# Altium footprint library BBC_Footprints.PcbLib: 172 footprints (part 10 of 11)
Each footprint in its own frame and in the unit in brackets; x right, y up, seen from the top. Pads: shape width x height; smd on the part's side, far side on the other; paste and mask are expansions set on the pad; w line width, h text height; cw(c..) or ccw(c..) is an arc to the next point about the centre after c.
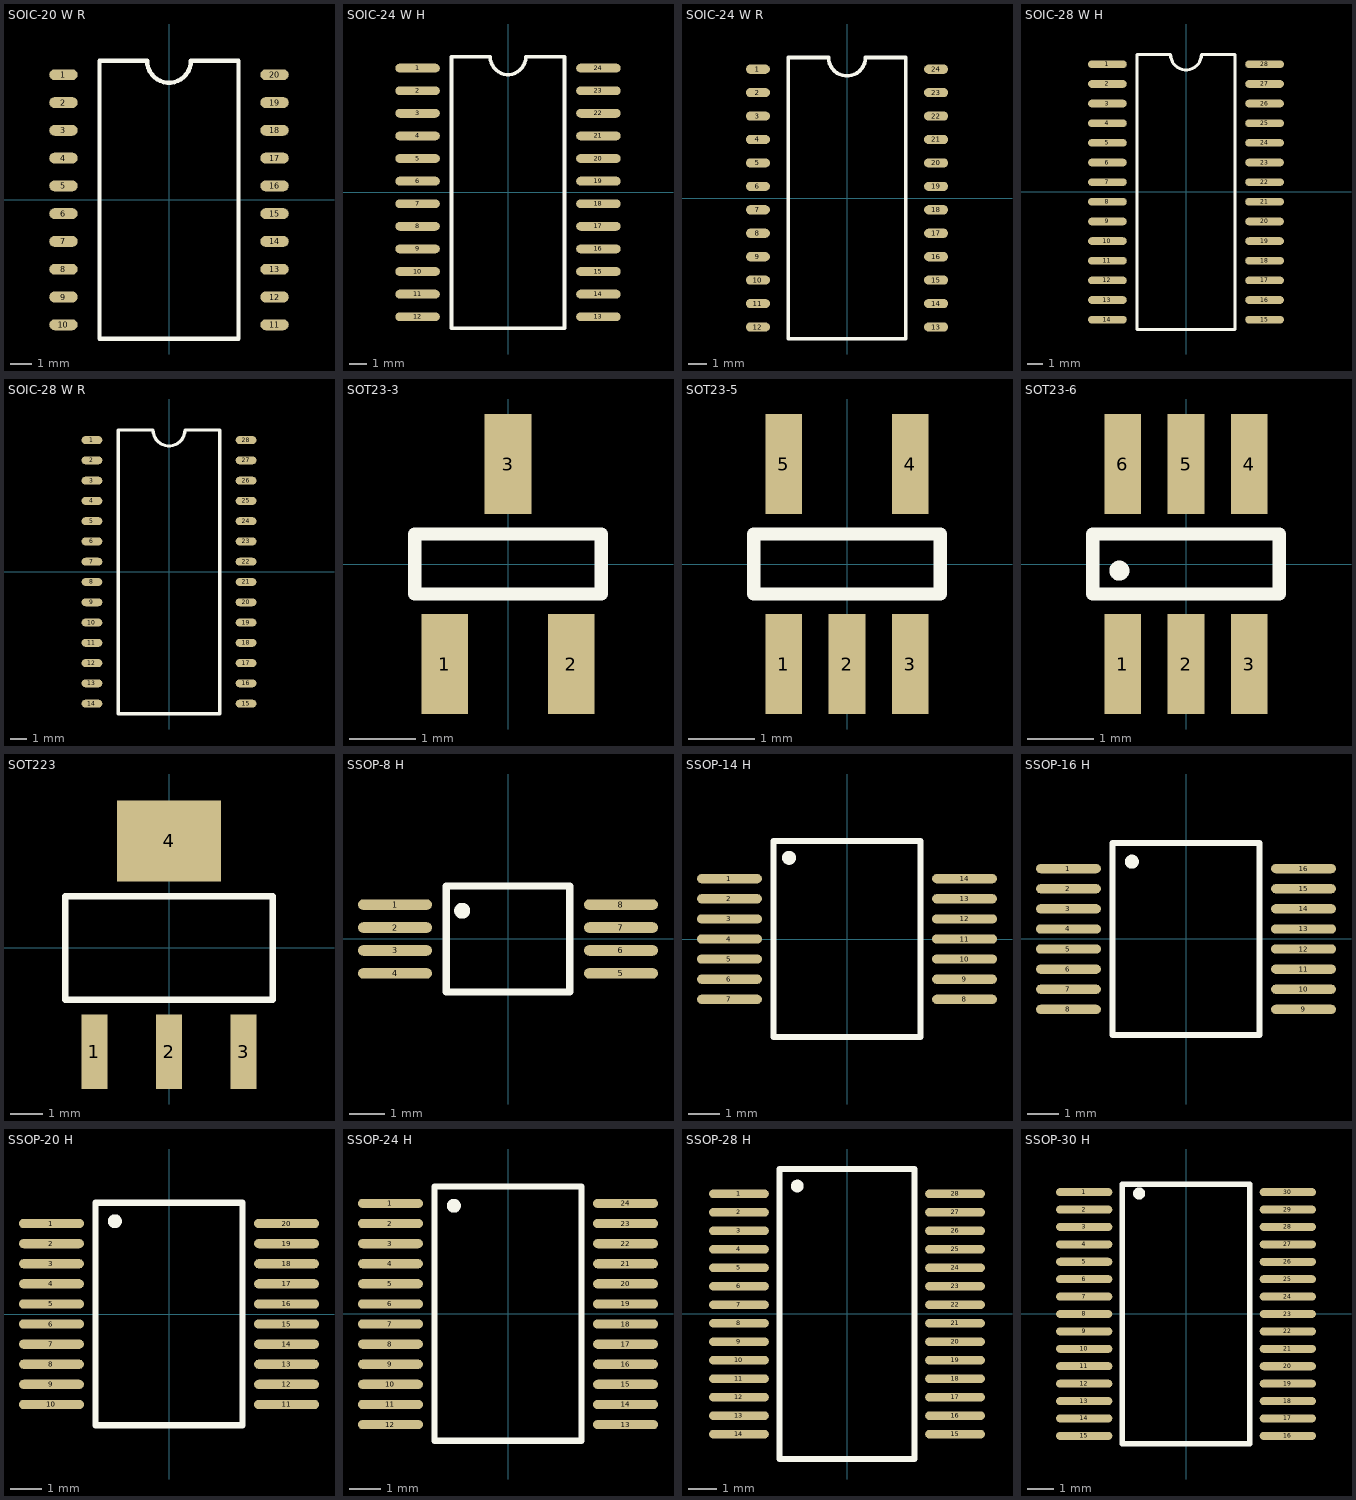
[diagram p9: the footprints below, top view; thin cyan lines are the x and y axes]

## SOIC-20 W R [mm] "Wide (300mil) SOIC with 20 pins for reflow soldering"
height 3
pads (20):
  oval 1.3x0.5 smd: 1(-4.826,5.715) 2(-4.826,4.445) 3(-4.826,3.175) 4(-4.826,1.905) 5(-4.826,0.635) 6(-4.826,-0.635) 7(-4.826,-1.905) 8(-4.826,-3.175) 9(-4.826,-4.445) 10(-4.826,-5.715) 11(4.826,-5.715) 12(4.826,-4.445) 13(4.826,-3.175) 14(4.826,-1.905) 15(4.826,-0.635) 16(4.826,0.635) 17(4.826,1.905) 18(4.826,3.175) 19(4.826,4.445) 20(4.826,5.715)
Top Overlay:
  lines w0.2: -3.175,-6.35 -3.175,6.35 -1,6.35 ccw(c0,6.35) 1,6.35 3.175,6.35 3.175,-6.35 -3.175,-6.35
3D body "SOIC-20 W.step": height 2.65, standoff 0, extent -5.242,-6.425 5.243,6.425

## SOIC-24 W H [mm] "Wide (300mil) SOIC with 24 pins for hand soldering"
height 3
pads (24):
  oval 2.5x0.5 smd: 1(-5.08,6.985) 2(-5.08,5.715) 3(-5.08,4.445) 4(-5.08,3.175) 5(-5.08,1.905) 6(-5.08,0.635) 7(-5.08,-0.635) 8(-5.08,-1.905) 9(-5.08,-3.175) 10(-5.08,-4.445) 11(-5.08,-5.715) 12(-5.08,-6.985) 13(5.08,-6.985) 14(5.08,-5.715) 15(5.08,-4.445) 16(5.08,-3.175) 17(5.08,-1.905) 18(5.08,-0.635) 19(5.08,0.635) 20(5.08,1.905) 21(5.08,3.175) 22(5.08,4.445) 23(5.08,5.715) 24(5.08,6.985)
Top Overlay:
  lines w0.2: -3.175,-7.62 3.175,-7.62 3.175,7.62 1,7.62 cw(c0,7.62) -1,7.62 -3.175,7.62 -3.175,-7.62
3D body "SOIC-24 W.step": height 2.65, standoff 0, extent -5.242,-7.725 5.243,7.725

## SOIC-24 W R [mm] "Wide (300mil) SOIC with 24 pins for reflow soldering"
height 3
pads (24):
  oval 1.3x0.5 smd: 1(-4.826,6.985) 2(-4.826,5.715) 3(-4.826,4.445) 4(-4.826,3.175) 5(-4.826,1.905) 6(-4.826,0.635) 7(-4.826,-0.635) 8(-4.826,-1.905) 9(-4.826,-3.175) 10(-4.826,-4.445) 11(-4.826,-5.715) 12(-4.826,-6.985) 13(4.826,-6.985) 14(4.826,-5.715) 15(4.826,-4.445) 16(4.826,-3.175) 17(4.826,-1.905) 18(4.826,-0.635) 19(4.826,0.635) 20(4.826,1.905) 21(4.826,3.175) 22(4.826,4.445) 23(4.826,5.715) 24(4.826,6.985)
Top Overlay:
  lines w0.2: -3.175,-7.62 3.175,-7.62 3.175,7.62 1,7.62 cw(c0,7.62) -1,7.62 -3.175,7.62 -3.175,-7.62
3D body "SOIC-24 W.step": height 2.65, standoff 0, extent -5.242,-7.725 5.243,7.725

## SOIC-28 W H [mm] "Wide (300mil) SOIC with 28 pins for hand soldering"
height 3
pads (28):
  oval 2.5x0.5 smd: 1(-5.08,8.255) 2(-5.08,6.985) 3(-5.08,5.715) 4(-5.08,4.445) 5(-5.08,3.175) 6(-5.08,1.905) 7(-5.08,0.635) 8(-5.08,-0.635) 9(-5.08,-1.905) 10(-5.08,-3.175) 11(-5.08,-4.445) 12(-5.08,-5.715) 13(-5.08,-6.985) 14(-5.08,-8.255) 15(5.08,-8.255) 16(5.08,-6.985) 17(5.08,-5.715) 18(5.08,-4.445) 19(5.08,-3.175) 20(5.08,-1.905) 21(5.08,-0.635) 22(5.08,0.635) 23(5.08,1.905) 24(5.08,3.175) 25(5.08,4.445) 26(5.08,5.715) 27(5.08,6.985) 28(5.08,8.255)
Top Overlay:
  lines w0.2: -3.175,-8.89 3.175,-8.89 3.175,8.89 1,8.89 cw(c0,8.89) -1,8.89 -3.175,8.89 -3.175,-8.89
3D body "SOIC-28 1.step": height 2.65, standoff 0, extent -5.242,-8.975 5.243,8.975

## SOIC-28 W R [mm] "Wide (300mil) SOIC with 28 pins for reflow soldering"
height 3
pads (28):
  oval 1.3x0.5 smd: 1(-4.826,8.255) 2(-4.826,6.985) 3(-4.826,5.715) 4(-4.826,4.445) 5(-4.826,3.175) 6(-4.826,1.905) 7(-4.826,0.635) 8(-4.826,-0.635) 9(-4.826,-1.905) 10(-4.826,-3.175) 11(-4.826,-4.445) 12(-4.826,-5.715) 13(-4.826,-6.985) 14(-4.826,-8.255) 15(4.826,-8.255) 16(4.826,-6.985) 17(4.826,-5.715) 18(4.826,-4.445) 19(4.826,-3.175) 20(4.826,-1.905) 21(4.826,-0.635) 22(4.826,0.635) 23(4.826,1.905) 24(4.826,3.175) 25(4.826,4.445) 26(4.826,5.715) 27(4.826,6.985) 28(4.826,8.255)
Top Overlay:
  lines w0.2: -3.175,-8.89 3.175,-8.89 3.175,8.89 1,8.89 cw(c0,8.89) -1,8.89 -3.175,8.89 -3.175,-8.89
3D body "SOIC-28 1.step": height 2.65, standoff 0, extent -5.242,-8.975 5.243,8.975

## SOT23-3 [mm] "SOT23-3"
height 1.45
pads (3):
  rect 0.7x1.5 smd: 1(-0.95,-1.5) 2(0.95,-1.5) 3(0,1.5)
Top Overlay:
  lines w0.2: -1.4,-0.45 1.4,-0.45 1.4,0.45 -1.4,0.45 -1.4,-0.45
3D body "User Library-SOT23-3.STEP": height 1.3, standoff 0, extent -1.45,-1.4 1.45,1.4

## SOT23-5 [mm] "SOT23-5"
height 1.45
pads (5):
  rect 0.55x1.5 smd: 1(-0.95,-1.5) 2(0,-1.5) 3(0.95,-1.5) 4(0.95,1.5) 5(-0.95,1.5)
Top Overlay:
  lines w0.2: -1.4,-0.45 1.4,-0.45 1.4,0.45 -1.4,0.45 -1.4,-0.45
3D body "User Library-SOT23-5.STEP": height 1.24, standoff 0.14, extent -1.452,-1.4 1.448,1.4

## SOT23-6 [mm] "SOT23-6"
height 1.45
pads (6):
  rect 0.55x1.5 smd: 1(-0.95,-1.5) 2(0,-1.5) 3(0.95,-1.5) 4(0.95,1.5) 5(0,1.5) 6(-0.95,1.5)
Top Overlay:
  circle w0.2: c-1,-0.1 r0.05
  lines w0.2: -1.4,-0.45 -1.4,0.45 1.4,0.45 1.4,-0.45 -1.4,-0.45
3D body "DBV-6 Package.stp": height 1.1, standoff -0.01, extent -1.46,-1.422 1.461,1.422

## SOT223 [mm] "SOT223"
height 1.45
pads (4):
  rect 0.8x2.3 smd: 1(-2.3,-3.2) 2(0,-3.2) 3(2.3,-3.2)
  rect 3.2x2.5 smd: 4(0,3.3)
Top Overlay:
  lines w0.2: -3.2,-1.6 3.2,-1.6 3.2,1.6 -3.2,1.6 -3.2,-1.6
3D body "SOT-223.step": height 1.7, standoff 0.02, extent -3.25,-3.48 3.25,3.48

## SSOP-8 H [mm] "SSOP-8 for hand soldering"
height 3
pads (8):
  oval 2.1x0.3 smd: 1(-3.2,0.975) 2(-3.2,0.325) 3(-3.2,-0.325) 4(-3.2,-0.975) 5(3.2,-0.975) 6(3.2,-0.325) 7(3.2,0.325) 8(3.2,0.975)
Top Overlay:
  circle w0.25: c-1.3,0.8 r0.1
  lines w0.2: -1.75,-1.5 1.75,-1.5 1.75,1.5 -1.75,1.5 -1.75,-1.5
3D body "SSOP-8.STEP": height 1.3, standoff 0, extent -3.2,-1.75 3.2,1.75

## SSOP-14 H [mm] "SSOP-14 for hand soldering"
height 3
pads (14):
  oval 2.1x0.3 smd: 1(-3.8,1.95) 2(-3.8,1.3) 3(-3.8,0.65) 4(-3.8,0) 5(-3.8,-0.65) 6(-3.8,-1.3) 7(-3.8,-1.95) 8(3.8,-1.95) 9(3.8,-1.3) 10(3.8,-0.65) 11(3.8,0) 12(3.8,0.65) 13(3.8,1.3) 14(3.8,1.95)
Top Overlay:
  circle w0.25: c-1.875,2.625 r0.1
  lines w0.2: -2.375,-3.165 -2.375,3.165 2.375,3.165 2.375,-3.165 -2.375,-3.165
3D body "User Library-IPC SO.step": height 2.14, standoff 0, extent -3.918,-3.165 3.918,3.165

## SSOP-16 H [mm] "SSOP-16 for hand soldering"
height 3
pads (16):
  oval 2.1x0.3 smd: 1(-3.8,2.275) 2(-3.8,1.625) 3(-3.8,0.975) 4(-3.8,0.325) 5(-3.8,-0.325) 6(-3.8,-0.975) 7(-3.8,-1.625) 8(-3.8,-2.275) 9(3.8,-2.275) 10(3.8,-1.625) 11(3.8,-0.975) 12(3.8,-0.325) 13(3.8,0.325) 14(3.8,0.975) 15(3.8,1.625) 16(3.8,2.275)
Top Overlay:
  circle w0.25: c-1.75,2.5 r0.1
  lines w0.2: -2.375,-3.1 -2.375,3.1 2.375,3.1 2.375,-3.1 -2.375,-3.1
3D body "SSOP-16.STEP": height 1.9, standoff 0, extent -3.9,-3.1 3.9,3.1

## SSOP-20 H [mm] "SSOP-20 for hand soldering"
height 3
pads (20):
  oval 2.1x0.3 smd: 1(-3.8,2.925) 2(-3.8,2.275) 3(-3.8,1.625) 4(-3.8,0.975) 5(-3.8,0.325) 6(-3.8,-0.325) 7(-3.8,-0.975) 8(-3.8,-1.625) 9(-3.8,-2.275) 10(-3.8,-2.925) 11(3.8,-2.925) 12(3.8,-2.275) 13(3.8,-1.625) 14(3.8,-0.975) 15(3.8,-0.325) 16(3.8,0.325) 17(3.8,0.975) 18(3.8,1.625) 19(3.8,2.275) 20(3.8,2.925)
Top Overlay:
  circle w0.25: c-1.75,3 r0.1
  lines w0.2: -2.375,-3.6 -2.375,3.6 2.375,3.6 2.375,-3.6 -2.375,-3.6
3D body "SSOP-20.STEP": height 1.9, standoff 0, extent -3.9,-3.6 3.9,3.6

## SSOP-24 H [mm] "SSOP-24 for hand soldering"
height 3
pads (24):
  oval 2.1x0.3 smd: 1(-3.8,3.575) 2(-3.8,2.925) 3(-3.8,2.275) 4(-3.8,1.625) 5(-3.8,0.975) 6(-3.8,0.325) 7(-3.8,-0.325) 8(-3.8,-0.975) 9(-3.8,-1.625) 10(-3.8,-2.275) 11(-3.8,-2.925) 12(-3.8,-3.575) 13(3.8,-3.575) 14(3.8,-2.925) 15(3.8,-2.275) 16(3.8,-1.625) 17(3.8,-0.975) 18(3.8,-0.325) 19(3.8,0.325) 20(3.8,0.975) 21(3.8,1.625) 22(3.8,2.275) 23(3.8,2.925) 24(3.8,3.575)
Top Overlay:
  circle w0.25: c-1.75,3.5 r0.1
  lines w0.2: -2.375,-4.1 -2.375,4.125 2.375,4.125 2.375,-4.1 -2.375,-4.1
3D body "SSOP-24.STEP": height 1.9, standoff 0, extent -3.9,-4.1 3.9,4.1

## SSOP-28 H [mm] "SSOP-28 for hand soldering"
height 3
pads (28):
  oval 2.1x0.3 smd: 1(-3.8,4.225) 2(-3.8,3.575) 3(-3.8,2.925) 4(-3.8,2.275) 5(-3.8,1.625) 6(-3.8,0.975) 7(-3.8,0.325) 8(-3.8,-0.325) 9(-3.8,-0.975) 10(-3.8,-1.625) 11(-3.8,-2.275) 12(-3.8,-2.925) 13(-3.8,-3.575) 14(-3.8,-4.225) 15(3.8,-4.225) 16(3.8,-3.575) 17(3.8,-2.925) 18(3.8,-2.275) 19(3.8,-1.625) 20(3.8,-0.975) 21(3.8,-0.325) 22(3.8,0.325) 23(3.8,0.975) 24(3.8,1.625) 25(3.8,2.275) 26(3.8,2.925) 27(3.8,3.575) 28(3.8,4.225)
Top Overlay:
  circle w0.25: c-1.75,4.5 r0.1
  lines w0.2: -2.375,-5.1 -2.375,5.1 2.375,5.1 2.375,-5.1 -2.375,-5.1
3D body "SSOP-28.STEP": height 1.9, standoff 0, extent -3.9,-5.1 3.9,5.1

## SSOP-30 H [mm] "SSOP-30 for hand soldering"
height 3
pads (30):
  oval 2.1x0.3 smd: 1(-3.8,4.55) 2(-3.8,3.9) 3(-3.8,3.25) 4(-3.8,2.6) 5(-3.8,1.95) 6(-3.8,1.3) 7(-3.8,0.65) 8(-3.8,0) 9(-3.8,-0.65) 10(-3.8,-1.3) 11(-3.8,-1.95) 12(-3.8,-2.6) 13(-3.8,-3.25) 14(-3.8,-3.9) 15(-3.8,-4.55) 16(3.8,-4.55) 17(3.8,-3.9) 18(3.8,-3.25) 19(3.8,-2.6) 20(3.8,-1.95) 21(3.8,-1.3) 22(3.8,-0.65) 23(3.8,0) 24(3.8,0.65) 25(3.8,1.3) 26(3.8,1.95) 27(3.8,2.6) 28(3.8,3.25) 29(3.8,3.9) 30(3.8,4.55)
Top Overlay:
  circle w0.25: c-1.75,4.5 r0.1
  lines w0.2: -2.375,-4.85 -2.375,4.85 2.375,4.85 2.375,-4.85 -2.375,-4.85
3D body "SSOP-30.STEP": height 1.95, standoff 0, extent -3.8,-4.85 3.8,4.85